# Altium footprint library Horizontal Plastic Modular Jack.PcbLib: 26 footprints (part 2 of 2)
Each footprint in its own frame and in the unit in brackets; x right, y up, seen from the top. Pads: shape width x height; smd on the part's side, far side on the other; paste and mask are expansions set on the pad; w line width, h text height; cw(c..) or ccw(c..) is an arc to the next point about the centre after c.
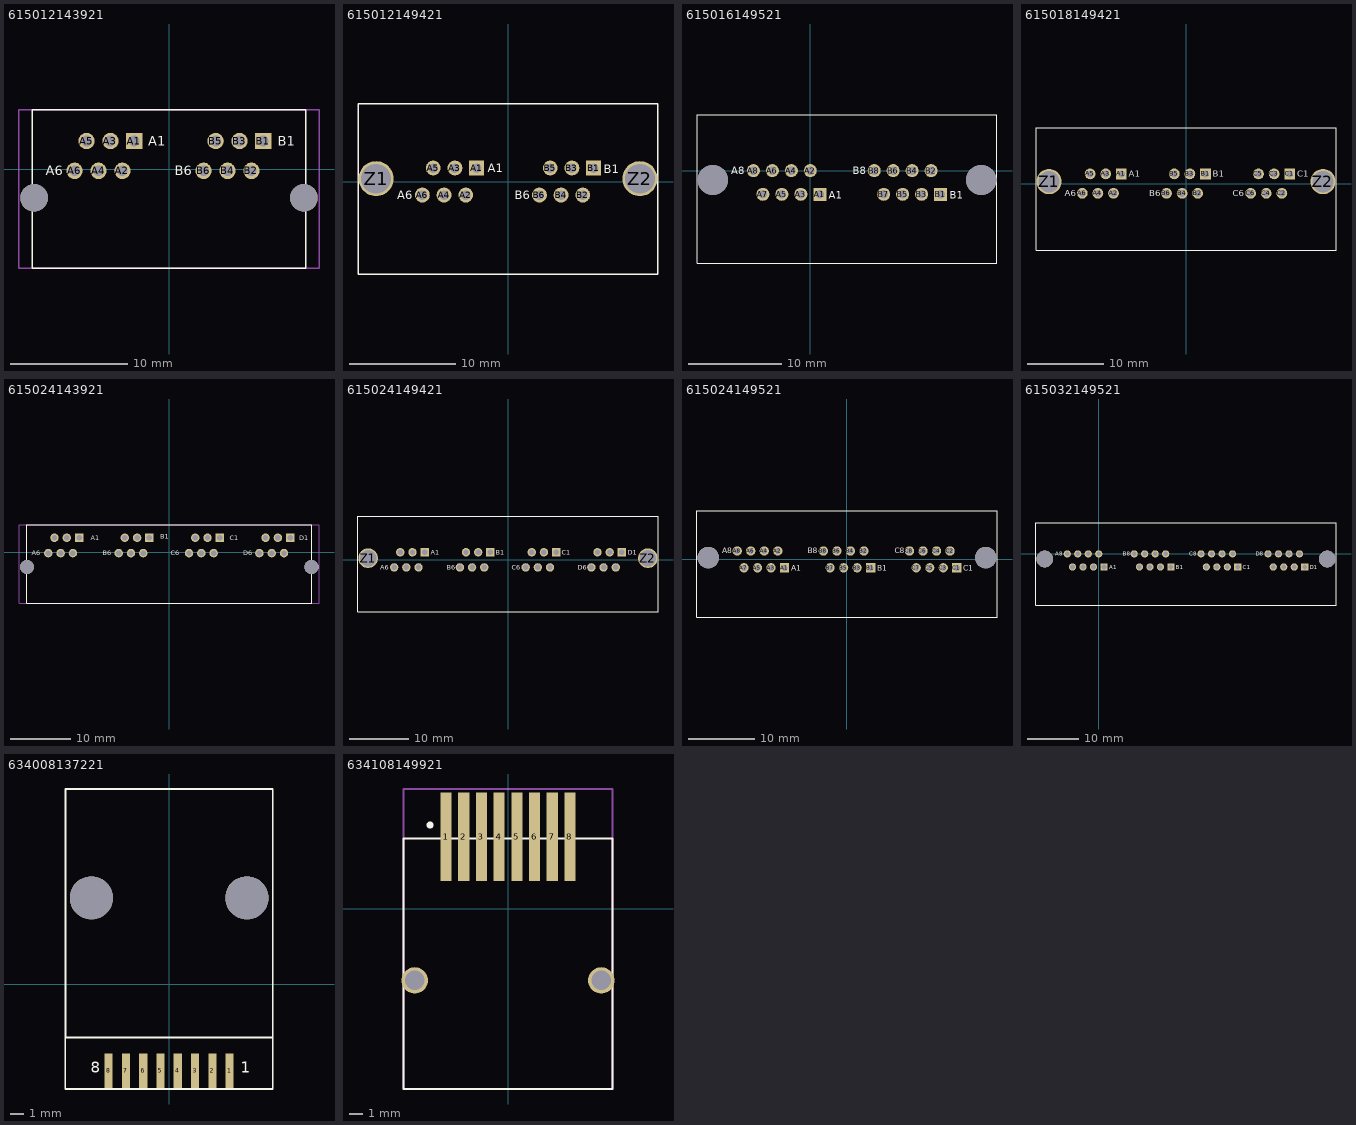
[diagram p1: the footprints below, top view; thin cyan lines are the x and y axes]

## 615012143921 [mm] "Horizontal Plastic 1x2 TH    6P6C Tab Up"
height 14
pads (14):
  rect 1.4x1.4 hole 0.9: A1(-2.95,2.42) B1(8.05,2.42)
  round 1.4 hole 0.9: A2(-3.97,-0.12) A3(-4.99,2.42) A4(-6.01,-0.12) A5(-7.03,2.42) A6(-8.05,-0.12) B2(7.03,-0.12) B3(6.01,2.42) B4(4.99,-0.12) B5(3.97,2.42) B6(2.95,-0.12)
  round 2.36 hole 2.36 unplated: ""(-11.5,-2.42) ""(11.5,-2.42)
Top Overlay:
  lines w0.127: -11.65,-8.42 11.65,-8.42 11.65,5.08 -11.65,5.08 -11.65,-8.42
  text "A1" at -1.75,2 h0.8
  text "A6" at -10.5,-0.5 h0.8
  text "B1" at 9.25,2 h0.8
  text "B6" at 0.5,-0.5 h0.8
Mechanical 15:
  lines w0.127: -12.787,-8.42 -12.787,5.08 12.787,5.08 12.787,-8.42 -12.787,-8.42
3D body: height 2.97, standoff -14.63, extent -12.787,-8.42 12.787,5.08

## 615012149421 [mm] "WR-MJ_Modular Jack_Tab UP_6P6C  Pre-Assembly 1x2"
height 15.4
pads (15):
  rect 1.4x1.4 hole 0.9: A1(-2.95,1.27) B1(8.05,1.27)
  round 1.4 hole 0.9: A2(-3.97,-1.27) A3(-4.99,1.27) A4(-6.01,-1.27) A5(-7.03,1.27) A6(-8.05,-1.27) B2(7.03,-1.27) B3(6.01,1.27) B4(4.99,-1.27) B5(3.97,1.27) B6(2.95,-1.27)
  round 3.3 hole 2.8: Z1(-12.4,0.27) Z2(12.4,0.27)
  round 2.8 smd: ""(-12.4,0.27)
Top Overlay:
  lines w0.127: -14.1,-8.7 -14.1,7.3 ; -14.1,-8.7 14.1,-8.7 ; -14.1,-8.7 -14.1,7.3 ; -14.1,-8.7 14.1,-8.7 ; -14.1,7.3 14.1,7.3 ; -14.1,7.3 14.1,7.3 ; 14.1,-8.7 14.1,7.3 ; 14.1,-8.7 14.1,7.3
  text "B6" at 0.635,-1.651 h0.8
  text "B1" at 9.017,0.762 h0.8
  text "A6" at -10.414,-1.651 h0.8
  text "A1" at -1.905,0.889 h0.8
3D body: height 15.41, standoff -4.13, extent -14.1,-8.7 14.01,7.3

## 615016149521 [mm] "WR-MJ_Modular Jack_Tab UP_8P8C Pre-Assembly 1x2"
height 15.4
pads (18):
  rect 1.4x1.4 hole 0.9: A1(1.02,-2.54) B1(14.02,-2.54)
  round 1.4 hole 0.9: A2(0,0) A3(-1.02,-2.54) A4(-2.04,0) A5(-3.06,-2.54) A6(-4.08,0) A7(-5.1,-2.54) A8(-6.12,0) B2(13,0) B3(11.98,-2.54) B4(10.96,0) B5(9.94,-2.54) B6(8.92,0) B7(7.9,-2.54) B8(6.88,0)
  round 3.25 hole 3.25 unplated: ""(-10.49,-1) ""(18.39,-1)
Top Overlay:
  lines w0.127: -12.19,-9.97 -12.19,6.03 ; -12.19,-9.97 20.09,-9.97 ; -12.19,-9.97 -12.19,6.03 ; -12.19,-9.97 20.09,-9.97 ; -12.19,6.03 20.09,6.03 ; -12.19,6.03 20.09,6.03 ; 20.09,-9.97 20.09,6.03 ; 20.09,-9.97 20.09,6.03
  text "A8" at -8.496,-0.382 h0.8
  text "B8" at 4.585,-0.382 h0.8
  text "B1" at 15,-3 h0.8
  text "A1" at 2,-3 h0.8
3D body: height 15.41, standoff -4.13, extent -12.19,-9.97 20.09,6.03

## 615018149421 [mm] "WR-MJ_Modular Jack_Tab UP_6P6C Pre-Assembly 1x3"
height 15.4
pads (20):
  rect 1.4x1.4 hole 0.9: A1(-8.45,1.27) B1(2.55,1.27) C1(13.55,1.27)
  round 1.4 hole 0.9: A2(-9.47,-1.27) A3(-10.49,1.27) A4(-11.51,-1.27) A5(-12.53,1.27) A6(-13.55,-1.27) B2(1.53,-1.27) B3(0.51,1.27) B4(-0.51,-1.27) B5(-1.53,1.27) B6(-2.55,-1.27) C2(12.53,-1.27) C3(11.51,1.27) C4(10.49,-1.27) C5(9.47,1.27) C6(8.45,-1.27)
  round 3.3 hole 2.8: Z1(-17.9,0.27) Z2(17.9,0.27)
Top Overlay:
  lines w0.127: -19.6,-8.7 19.6,-8.7 19.6,7.3 -19.6,7.3 -19.6,-8.7
  text "C1" at 14.518,0.889 h0.8
  text "C6" at 6.136,-1.651 h0.8
  text "B6" at -4.786,-1.651 h0.8
  text "B1" at 3.469,0.889 h0.8
  text "A6" at -15.835,-1.651 h0.8
  text "A1" at -7.453,0.889 h0.8
3D body: height 15.41, standoff -4.13, extent -19.6,-8.7 19.51,7.3

## 615024143921 [mm] "Horizontal Plastic 1x4 TH    6P6C Tab Up"
height 14.55
pads (26):
  rect 1.4x1.4 hole 0.9: A1(-14.925,2.42) B1(-3.275,2.42) C1(8.375,2.42) D1(20.025,2.42)
  round 1.4 hole 0.9: A2(-15.945,-0.12) A3(-16.965,2.42) A4(-17.985,-0.12) A5(-19.005,2.42) A6(-20.025,-0.12) B2(-4.295,-0.12) B3(-5.315,2.42) B4(-6.335,-0.12) B5(-7.355,2.42) B6(-8.375,-0.12) C2(7.355,-0.12) C3(6.335,2.42) C4(5.315,-0.12) C5(4.295,2.42) C6(3.275,-0.12) D2(19.005,-0.12) D3(17.985,2.42) D4(16.965,-0.12) D5(15.945,2.42) D6(14.925,-0.12)
  round 2.36 hole 2.36 unplated: ""(-23.55,-2.42) ""(23.55,-2.42)
Top Overlay:
  lines w0.127: -23.575,-8.42 23.575,-8.42 23.575,4.58 -23.575,4.58 -23.575,-8.42
  text "D1" at 21.5,2 h0.8
  text "D6" at 12.25,-0.5 h0.8
  text "C1" at 10,2 h0.8
  text "C6" at 0.25,-0.5 h0.8
  text "B6" at -11,-0.5 h0.8
  text "B1" at -1.5,2.25 h0.8
  text "A6" at -22.75,-0.5 h0.8
  text "A1" at -13,2 h0.8
Mechanical 15:
  lines w0.127: -24.88,-8.42 -24.88,4.58 24.8,4.58 24.8,-8.42 -24.88,-8.42
3D body: height 2.78, standoff -14.97, extent -24.88,-8.425 24.8,4.575

## 615024149421 [mm] "WR-MJ_Modular Jack_Tab UP_6P6C Pre-Assembly 1x4"
height 15.4
pads (26):
  rect 1.4x1.4 hole 0.9: A1(-13.95,1.27) B1(-2.95,1.27) C1(8.05,1.27) D1(19.05,1.27)
  round 1.4 hole 0.9: A2(-14.971,-1.27) A3(-15.991,1.27) A4(-17.01,-1.27) A5(-18.03,1.27) A6(-19.051,-1.27) B2(-3.971,-1.27) B3(-4.991,1.27) B4(-6.01,-1.27) B5(-7.03,1.27) B6(-8.051,-1.27) C2(7.029,-1.27) C3(6.009,1.27) C4(4.99,-1.27) C5(3.969,1.27) C6(2.949,-1.27) D2(18.03,-1.27) D3(17.011,1.27) D4(15.991,-1.27) D5(14.97,1.27) D6(13.95,-1.27)
  round 3.3 hole 2.8: Z1(-23.4,0.27) Z2(23.4,0.27)
Top Overlay:
  lines w0.127: -25.1,-8.7 25.1,-8.7 ; -25.1,-8.7 -25.1,7.3 ; -25.1,-8.7 25.1,-8.7 ; -25.1,-8.7 -25.1,7.3 ; -25.1,7.3 25.1,7.3 ; -25.1,7.3 25.1,7.3 ; 25.1,-8.7 25.1,7.3 ; 25.1,-8.7 25.1,7.3
  text "A1" at -12.954,0.889 h0.8
  text "A6" at -21.336,-1.651 h0.8
  text "B1" at -2.032,0.889 h0.8
  text "B6" at -10.287,-1.651 h0.8
  text "C6" at 0.635,-1.651 h0.8
  text "C1" at 9.017,0.889 h0.8
  text "D6" at 11.684,-1.651 h0.8
  text "D1" at 20.066,0.889 h0.8
3D body: height 15.41, standoff -4.13, extent -25.1,-8.7 25.009,7.3

## 615024149521 [mm] "WR-MJ_Modular Jack_Tab UP_8P8C Pre-Assembly 1x3"
height 15.4
pads (26):
  rect 1.4x1.4 hole 0.9: A1(-9.43,-1.27) B1(3.57,-1.27) C1(16.57,-1.27)
  round 1.4 hole 0.9: A2(-10.45,1.27) A3(-11.47,-1.27) A4(-12.49,1.27) A5(-13.51,-1.27) A6(-14.53,1.27) A7(-15.55,-1.27) A8(-16.57,1.27) B2(2.55,1.27) B3(1.53,-1.27) B4(0.51,1.27) B5(-0.51,-1.27) B6(-1.53,1.27) B7(-2.55,-1.27) B8(-3.57,1.27) C2(15.55,1.27) C3(14.53,-1.27) C4(13.51,1.27) C5(12.49,-1.27) C6(11.47,1.27) C7(10.45,-1.27) C8(9.43,1.27)
  round 3.25 hole 3.25 unplated: ""(-20.94,0.27) ""(20.94,0.27)
Top Overlay:
  lines w0.127: -22.64,-8.7 22.64,-8.7 ; -22.64,-8.7 -22.64,7.3 ; -22.64,-8.7 22.64,-8.7 ; -22.64,-8.7 -22.64,7.3 ; -22.64,7.3 22.64,7.3 ; -22.64,7.3 22.64,7.3 ; 22.64,-8.7 22.64,7.3 ; 22.64,-8.7 22.64,7.3
  text "A1" at -8.45,-1.73 h0.8
  text "B1" at 4.55,-1.73 h0.8
  text "B8" at -5.902,0.889 h0.8
  text "A8" at -18.856,0.889 h0.8
  text "C1" at 17.55,-1.73 h0.8
  text "C8" at 7.179,0.889 h0.8
3D body: height 15.41, standoff -4.13, extent -22.64,-8.7 22.64,7.3

## 615032149521 [mm] "WR-MJ_Modular Jack_Tab UP_8P8C Pre-Assembly 1x3"
height 15.4
pads (34):
  rect 1.4x1.4 hole 0.9: A1(1.02,-2.54) B1(14.02,-2.54) C1(27.02,-2.54) D1(40.02,-2.54)
  round 1.4 hole 0.9: A2(0,0) A3(-1.02,-2.54) A4(-2.04,0) A5(-3.06,-2.54) A6(-4.08,0) A7(-5.1,-2.54) A8(-6.12,0) B2(13,0) B3(11.98,-2.54) B4(10.96,0) B5(9.94,-2.54) B6(8.92,0) B7(7.9,-2.54) B8(6.88,0) C2(26,0) C3(24.98,-2.54) C4(23.96,0) C5(22.94,-2.54) C6(21.92,0) C7(20.9,-2.54) C8(19.88,0) D2(39,0) D3(37.98,-2.54) D4(36.96,0) D5(35.94,-2.54) D6(34.92,0) D7(33.9,-2.54) D8(32.88,0)
  round 3.25 hole 3.25 unplated: ""(-10.49,-1) ""(44.39,-1)
Top Overlay:
  lines w0.127: -12.19,-9.97 -12.19,6.03 ; -12.19,-9.97 46.09,-9.97 ; -12.19,-9.97 -12.19,6.03 ; -12.19,-9.97 46.09,-9.97 ; -12.19,6.03 46.09,6.03 ; -12.19,6.03 46.09,6.03 ; 46.09,-9.97 46.09,6.03 ; 46.09,-9.97 46.09,6.03
  text "D8" at 30.539,-0.382 h0.8
  text "D1" at 41,-3 h0.8
  text "C8" at 17.585,-0.382 h0.8
  text "C1" at 28,-3 h0.8
  text "A8" at -8.45,-0.382 h0.8
  text "B8" at 4.631,-0.382 h0.8
  text "B1" at 15,-3 h0.8
  text "A1" at 2,-3 h0.8
3D body: height 15.41, standoff -4.13, extent -12.19,-9.97 46.09,6.03

## 634008137221 [mm] "RJ45 Horizontal SMT Tab down"
height 12.6
pads (10):
  rect 0.6x2.54 smd: 1(4.445,-6.35) 2(3.175,-6.35) 3(1.905,-6.35) 4(0.635,-6.35) 5(-0.635,-6.35) 6(-1.905,-6.35) 7(-3.175,-6.35) 8(-4.445,-6.35)
  round 3.17 hole 3.17 unplated: ""(-5.715,6.35) ""(5.715,6.35)
Top Overlay:
  lines w0.127: 7.62,14.35 -7.62,14.35 -7.62,-3.91 7.62,-3.91 7.62,14.35 ; 7.62,14.35 -7.64,14.35 -7.64,-7.7 7.62,-7.7 7.62,14.35
  text "1" at 5.25,-6.5 h0.8
  text "8" at -5.75,-6.5 h0.8
3D body: height 2.93, standoff -13.43, extent -7.62,-6.708 7.62,14.35

## 634108149921 [mm] "WR-MJ_Modular Jack_Tab DOWN_10P8C"
height 11.5
pads (10):
  rect 0.8x6.35 smd: 1(-4.445,5.162) 2(-3.175,5.162) 3(-1.905,5.162) 4(-0.635,5.162) 5(0.635,5.162) 6(1.905,5.162) 7(3.175,5.162) 8(4.445,5.162)
  round 1.9 hole 1.4: ""(-6.7,-5.162) ""(6.7,-5.162)
Top Overlay:
  circle w0.3: c-5.6,6 r0.1
  lines w0.127: -7.5,-12.962 -7.5,5.037 7.5,5.037 7.5,-12.962 -7.5,-12.962
Mechanical 15:
  lines w0.127: -7.5,-12.962 -7.5,8.587 7.5,8.587 7.5,-12.962 -7.5,-12.962
3D body: height 11.57, standoff -2.03, extent -7.5,-12.962 7.5,7.937